# Altium footprint library Dr.Xiong_20160818.PcbLib: 266 footprints (part 12 of 17)
Each footprint in its own frame and in the unit in brackets; x right, y up, seen from the top. Pads: shape width x height; smd on the part's side, far side on the other; paste and mask are expansions set on the pad; w line width, h text height; cw(c..) or ccw(c..) is an arc to the next point about the centre after c.
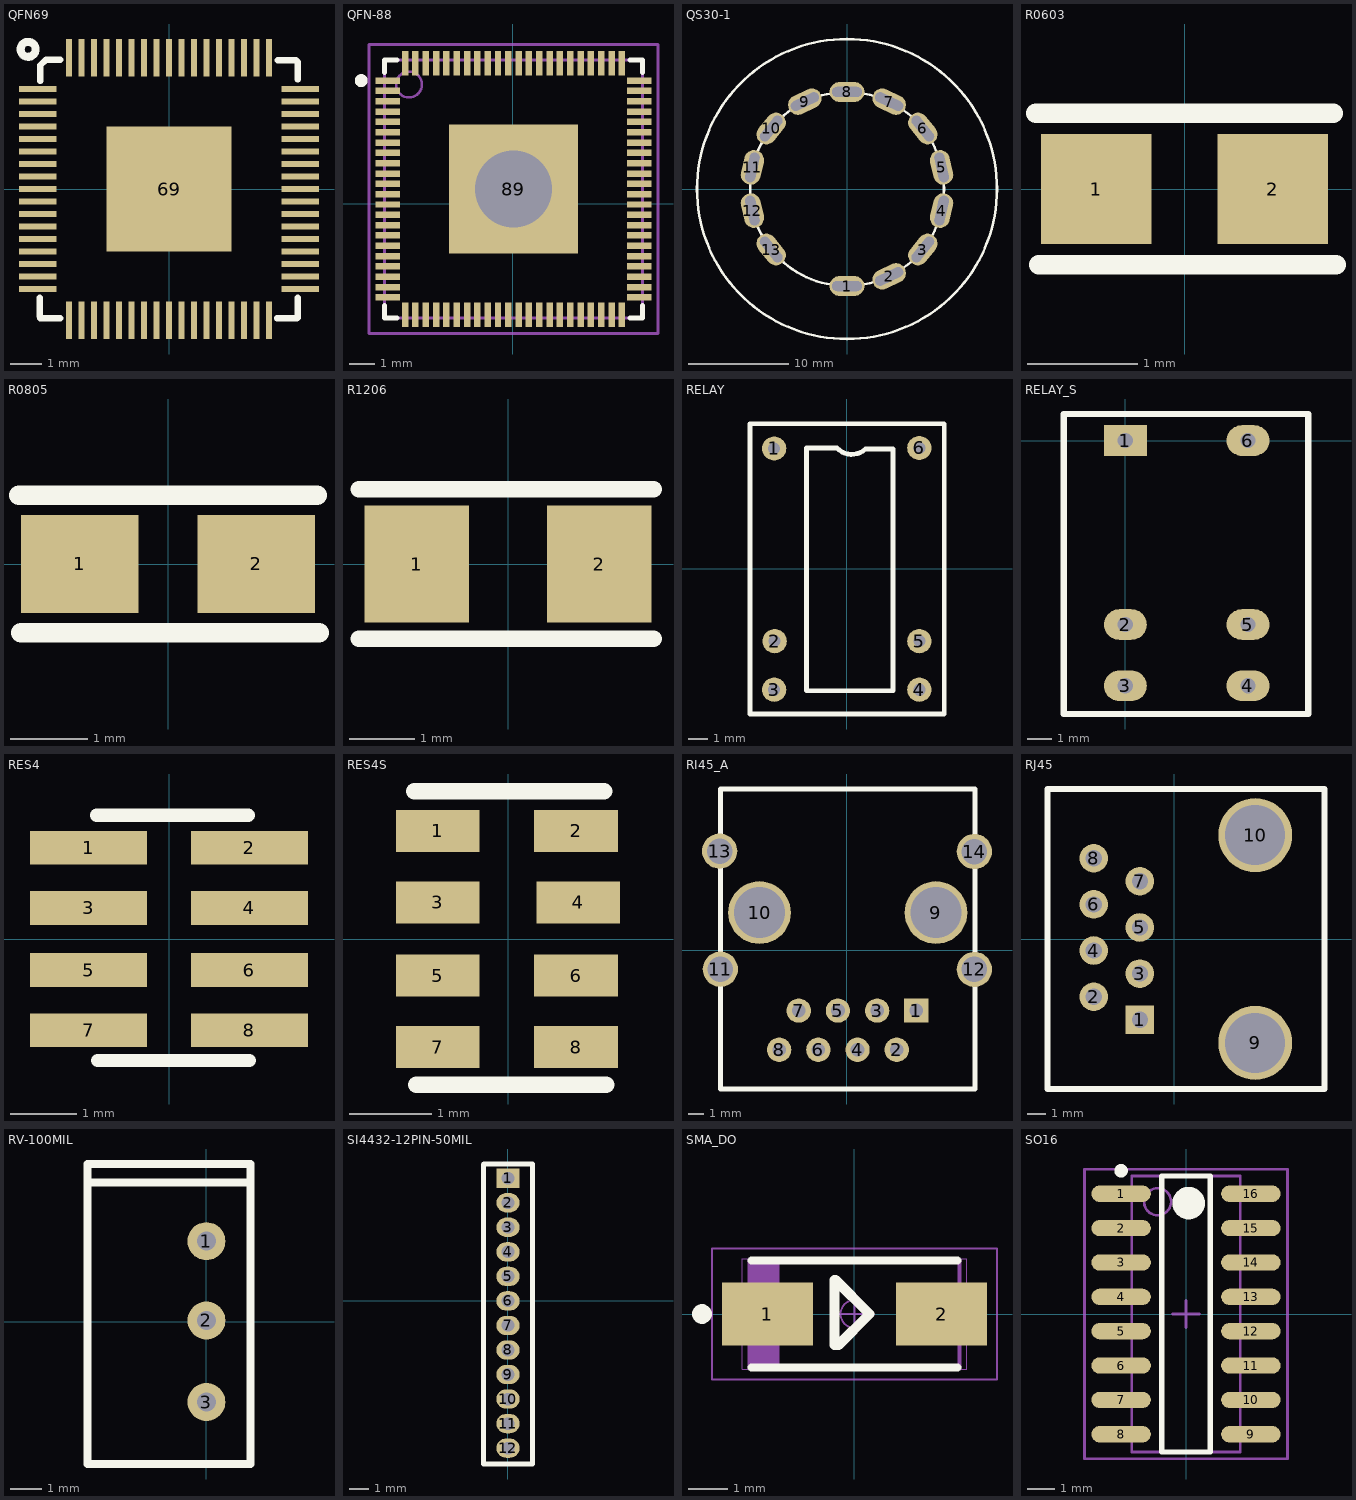
[diagram p11: the footprints below, top view; thin cyan lines are the x and y axes]

## QFN69 [mm]
pads (69):
  rect 1.2x0.2 smd: 1(-4.2,3.2) 2(-4.2,2.8) 3(-4.2,2.4) 4(-4.2,2) 5(-4.2,1.6) 6(-4.2,1.2) 7(-4.2,0.8) 8(-4.2,0.4) 9(-4.2,0) 10(-4.2,-0.4) 11(-4.2,-0.8) 12(-4.2,-1.2) 13(-4.2,-1.6) 14(-4.2,-2) 15(-4.2,-2.4) 16(-4.2,-2.8) 17(-4.2,-3.2) 35(4.2,-3.2) 36(4.2,-2.8) 37(4.2,-2.4) 38(4.2,-2) 39(4.2,-1.6) 40(4.2,-1.2) 41(4.2,-0.8) 42(4.2,-0.4) 43(4.2,0) 44(4.2,0.4) 45(4.2,0.8) 46(4.2,1.2) 47(4.2,1.6) 48(4.2,2) 49(4.2,2.4) 50(4.2,2.8) 51(4.2,3.2)
  rect 0.2x1.2 smd: 18(-3.2,-4.2) 19(-2.8,-4.2) 20(-2.4,-4.2) 21(-2,-4.2) 22(-1.6,-4.2) 23(-1.2,-4.2) 24(-0.8,-4.2) 25(-0.4,-4.2) 26(0,-4.2) 27(0.4,-4.2) 28(0.8,-4.2) 29(1.2,-4.2) 30(1.6,-4.2) 31(2,-4.2) 32(2.4,-4.2) 33(2.8,-4.2) 34(3.2,-4.2) 52(3.2,4.2) 53(2.8,4.2) 54(2.4,4.2) 55(2,4.2) 56(1.6,4.2) 57(1.2,4.2) 58(0.8,4.2) 59(0.4,4.2) 60(0,4.2) 61(-0.4,4.2) 62(-0.8,4.2) 63(-1.2,4.2) 64(-1.6,4.2) 65(-2,4.2) 66(-2.4,4.2) 67(-2.8,4.2) 68(-3.2,4.2)
  rect 4x4 smd: 69(0,0)
Top Overlay:
  circle w0.254: c-4.508,4.47 r0.241
  lines w0.203: -4.14,-3.48 -4.14,-4.064 -4.115,-4.14 -3.48,-4.14 ; -4.115,3.454 -4.115,3.962 -3.937,4.14 -3.48,4.14 ; 3.454,-4.14 4.089,-4.14 4.115,-4.115 4.115,-3.48 ; 3.48,4.115 4.064,4.115 4.115,4.064 4.115,3.505

## QFN-88 [mm]
pads (89):
  rect 0.95x0.249 smd: 1(-4.844,4.769) 3(-4.844,3.969) 5(-4.844,3.169) 7(-4.844,2.369) 9(-4.844,1.569) 11(-4.844,0.769) 13(-4.844,-0.031) 14(-4.844,-0.43) 15(-4.844,-0.831) 16(-4.844,-1.23) 17(-4.844,-1.631) 18(-4.844,-2.03) 19(-4.844,-2.432) 20(-4.844,-2.83) 22(-4.844,-3.63) 45(4.907,-3.63) 47(4.907,-2.83) 48(4.907,-2.432) 49(4.907,-2.03) 50(4.907,-1.631) 51(4.907,-1.23) 52(4.907,-0.831) 53(4.907,-0.43) 54(4.907,-0.031) 56(4.907,0.769) 58(4.907,1.569) 60(4.907,2.369) 62(4.907,3.169) 64(4.907,3.969) 66(4.907,4.769)
  rect 0.95x0.251 smd: 2(-4.844,4.369) 4(-4.844,3.569) 6(-4.844,2.769) 8(-4.844,1.969) 10(-4.844,1.169) 12(-4.844,0.369) 21(-4.844,-3.23) 46(4.907,-3.23) 55(4.907,0.369) 57(4.907,1.169) 59(4.907,1.969) 61(4.907,2.769) 63(4.907,3.569) 65(4.907,4.369)
  rect 0.249x0.95 smd: 23(-4.169,-4.306) 24(-3.77,-4.306) 25(-3.369,-4.306) 26(-2.97,-4.306) 27(-2.569,-4.306) 28(-2.17,-4.306) 30(-1.37,-4.306) 32(-0.57,-4.306) 34(0.231,-4.306) 36(1.031,-4.306) 38(1.831,-4.306) 40(2.631,-4.306) 42(3.431,-4.306) 44(4.231,-4.306) 67(4.231,5.445) 69(3.431,5.445) 71(2.631,5.445) 73(1.831,5.445) 75(1.031,5.445) 77(0.231,5.445) 79(-0.57,5.445) 81(-1.37,5.445) 83(-2.17,5.445) 84(-2.569,5.445) 85(-2.97,5.445) 86(-3.369,5.445) 87(-3.77,5.445) 88(-4.169,5.445)
  rect 0.251x0.95 smd: 29(-1.77,-4.306) 31(-0.97,-4.306) 33(-0.17,-4.306) 35(0.631,-4.306) 37(1.431,-4.306) 39(2.231,-4.306) 41(3.031,-4.306) 43(3.831,-4.306) 68(3.831,5.445) 70(3.031,5.445) 72(2.231,5.445) 74(1.431,5.445) 76(0.631,5.445) 78(-0.17,5.445) 80(-0.97,5.445) 82(-1.77,5.445)
  rect 5x5 hole 3: 89(0.031,0.569)
via 0.03,0.568 diameter 0.66 hole 0.33
Top Overlay:
  lines w0.2: -4.969,-3.956 -4.969,-4.431 -4.494,-4.431 ; -4.969,5.094 -4.969,5.569 -4.494,5.569 ; 4.556,-4.431 5.031,-4.431 5.031,-3.956 ; 4.556,5.569 5.031,5.569 5.031,5.094
  lines w0.25: -5.745,4.758 cw(c-5.869,4.769) -5.744,4.769
Mechanical 3:
  lines w0.1: -3.52,4.608 cw(c-4.019,4.618) -3.519,4.619 ; -0.471,0.568 0.53,0.568 ; 0.03,0.07 0.03,1.069 ; -5.568,-5.03 -5.568,6.169 5.631,6.169 5.631,-5.03 -5.568,-5.03 ; -4.969,-4.431 -4.969,5.569 5.031,5.569 5.031,-4.431 -4.969,-4.431
Mechanical 15:
  lines w0.003: 1.215,0.671 1.265,0.722

## QS30-1 [mm]
pads (13):
  oval 3.5x2 hole 1 slot 3 at 0 deg: 1(0,-9.7) 8(0,9.7)
  oval 2x3.5 hole 1 slot 3 at 25.71 deg rot 115.71: 2(4.21,-8.74) 9(-4.21,8.74)
  oval 2x3.5 hole 1 slot 3 at 51.43 deg rot 141.43: 3(7.58,-6.05) 10(-7.58,6.05)
  oval 2x3.5 hole 1 slot 3 at 77.14 deg rot 167.14: 4(9.46,-2.16) 11(-9.46,2.16)
  oval 2x3.5 hole 1 slot 3 at 102.86 deg rot 12.86: 5(9.46,2.16) 12(-9.46,-2.16)
  oval 2x3.5 hole 1 slot 3 at 128.57 deg rot 38.57: 6(7.58,6.05) 13(-7.58,-6.05)
  oval 2x3.5 hole 1 slot 3 at 154.28 deg rot 64.28: 7(4.21,8.74)
Top Overlay:
  circle w0.254: c0,0 r15
  circle w0.254: c0,0 r9.7

## R0603 [mm]
pads (2):
  rect 1x1 smd: 1(-0.799,0) 2(0.799,0)
Top Overlay:
  lines w0.178: -1.346,0.686 1.346,0.686 ; -1.321,-0.686 1.372,-0.686

## R0805 [mil]
pads (2):
  rect 60x50 smd: 1(-45,0) 2(45,0)
Top Overlay:
  lines w10: -76,35 76,35 ; -75,-35 77,-35

## R1206 [mm]
pads (2):
  rect 1.6x1.8 smd: 1(-1.4,0) 2(1.4,0)
Top Overlay:
  lines w0.254: -2.286,-1.143 2.235,-1.143 ; -2.286,1.143 2.235,1.143

## RELAY [mm]
pads (6):
  round 1.27 hole 0.635: 1(-3.812,6.325) 2(-3.787,-3.8) 3(-3.812,-6.35) 4(3.813,-6.35) 5(3.813,-3.8) 6(3.812,6.35)
Top Overlay:
  lines w0.254: -5.1,7.625 5.1,7.625 5.125,7.6 5.125,-7.625 -5.075,-7.625 -5.075,7.625 ; 2.437,-6.4 -2.112,-6.4 -2.112,6.35 -0.512,6.35 ccw(c0.263,7.075) 0.988,6.3 2.438,6.3 2.438,-6.4 ; 2.437,-6.4 2.438,-6.4

## RELAY_S [mil]
pads (6):
  rect 70x50 hole 25: 1(0,0)
  oval 70x50 hole 25: 2(0,-300) 3(0,-400) 4(200,-400) 5(200,-300) 6(200,0)
Top Overlay:
  lines w10: -100.39,-445.87 -100.39,43.31 298.23,43.31 298.23,-445.87 -100.39,-445.87

## RES4 [mil]
pads (8):
  rect 70x20 smd: 1(-48,54.5) 2(48,54.5) 3(-48,18.5) 4(48,18.5) 5(-48,-18.5) 6(48,-18.5) 7(-48,-54.5) 8(48,-54.5)
Top Overlay:
  lines w7.87: -43.31,73.82 47.24,73.82 ; -42.55,-72.5 48,-72.5

## RES4S [mil]
pads (8):
  rect 40x20 smd: 1(-33.5,51.5) 2(32.5,51.5) 3(-33.5,17.5) 4(33.5,17.5) 5(-33.5,-17.5) 6(32.5,-17.5) 7(-33.5,-51.5) 8(32.5,-51.5)
Top Overlay:
  lines w7.87: -44.79,70.37 45.76,70.37 ; -43.81,-69.4 46.74,-69.4

## RI45_A [mil]
pads (14):
  rect 62x62 hole 35: 1(176.89,-153.35)
  round 62 hole 35: 2(126.89,-253.35) 3(76.89,-153.35) 4(26.89,-253.35) 5(-23.11,-153.35) 6(-73.11,-253.35) 7(-123.11,-153.35) 8(-173.11,-253.35)
  round 160 hole 130 unplated: 9(226.89,96.65) 10(-223.11,96.65)
  round 90 hole 65: 11(-322.93,-47.83) 12(324.89,-48.35) 13(-324.89,253.35) 14(324.71,252.36)
Top Overlay:
  lines w13: -323.11,-353.35 -323.11,411.81 326.89,411.81 326.89,-353.35 -323.11,-353.35

## RJ45 [mil]
pads (10):
  rect 62x62 hole 35: 1(-75,-175)
  round 62 hole 35: 2(-175,-125) 3(-75,-75) 4(-175,-25) 5(-75,25) 6(-175,75) 7(-75,125) 8(-175,175)
  round 160 hole 130 unplated: 9(175,-225) 10(175,225)
Top Overlay:
  lines w13: -275,-325 325,-325 325,325 -275,325 -275,-325

## RV-100MIL [mm]
pads (3):
  round 1.2 hole 0.6: 1(0,2.54) 2(0,0.038) 3(0,-2.54)
Top Overlay:
  lines w0.254: -3.708,4.394 1.295,4.394 ; -3.759,-4.496 -1.765,-4.496 1.397,-4.496 1.397,4.978 -1.46,4.978 -3.759,4.978 -3.759,-4.496

## SI4432-12PIN-50MIL [mm]
pads (12):
  rect 1.2x1 hole 0.65: 1(0,6.35)
  oval 1.2x1 hole 0.65: 2(0,5.08) 3(0,3.81) 4(0,2.54) 5(0,1.27) 6(0,0) 7(0,-1.27) 8(0,-2.54) 9(0,-3.81) 10(0,-5.08) 11(0,-6.352) 12(0,-7.622)
Top Overlay:
  lines w0.254: -1.27,-8.433 1.27,-8.433 1.27,7.087 -1.245,7.087 -1.27,7.061 -1.27,-8.433
Bottom Overlay:
  lines w0.254: -1.27,-5.82 -1.27,7.087 ; -1.27,-5.763 -1.27,0.737 ; -1.27,-5.39 -1.27,-8.353 -1.181,-8.442 1.271,-8.442 1.27,-8.441 1.27,-4.729 ; -1.27,0.587 -1.27,7.087 ; -1.27,1.83 -1.27,-3.29 ; 1.27,-5.766 1.27,0.734 ; 1.27,-3.47 1.27,-5.82 ; 1.27,-3.29 1.27,0.83 ; 1.27,0.584 1.27,7.084 1.268,7.087 -1.27,7.087 ; -1.27,-3.29 -1.27,-3.29 ; 1.27,-5.82 1.27,-5.82

## SMA_DO [mm]
pads (2):
  rect 2.3x1.6 smd: 1(-2.2,0) 2(2.2,0)
Top Overlay:
  circle w0.25: c-3.85,0 r0.125
  lines w0.2: -2.6,-1.35 2.6,-1.35 ; -2.6,1.35 2.6,1.35
  lines w0.254: -0.508,0.864 -0.508,-0.787 -0.406,-0.787 0.381,0 ; -0.483,0.864 0.381,0 ; 0.356,0 0.381,0
Mechanical 15:
  lines w0.1: -2.548,-1.335 -2.548,1.335 ; -2.448,-1.335 -2.448,1.335 ; -2.348,-1.335 -2.348,1.335 ; -2.248,-1.335 -2.248,1.335 ; -2.148,-1.335 -2.148,1.335 ; -2.047,-1.335 -2.047,1.335 ; -1.948,-1.335 -1.948,1.335 ; -2.648,-1.335 -2.648,1.335 2.648,1.335 2.648,-1.335 -2.648,-1.335
Mechanical 16:
  circle w0.05: c0,0 r0.35
  lines w0.001: -2.83,-1.4 -2.83,1.4 2.83,1.4 2.83,-1.4 -2.83,-1.4
  lines w0.05: -0.5,0 0.5,0 ; 0,-0.5 0,0.5 ; -3.6,-1.65 -3.6,1.65 3.6,1.65 3.6,-1.65 -3.6,-1.65

## SO16 [mm]
pads (16):
  oval 2.2x0.6 smd: 1(-2.4,4.445) 2(-2.4,3.175) 3(-2.4,1.905) 4(-2.4,0.635) 5(-2.4,-0.635) 6(-2.4,-1.905) 7(-2.4,-3.175) 8(-2.4,-4.445) 9(2.4,-4.445) 10(2.4,-3.175) 11(2.4,-1.905) 12(2.4,-0.635) 13(2.4,0.635) 14(2.4,1.905) 15(2.4,3.175) 16(2.4,4.445)
Top Overlay:
  circle w0.25: c-2.4,5.295 r0.125
  circle w0.6: c0.1,4.1 r0.3
  lines w0.2: -0.9,-5.1 -0.9,5.1 0.9,5.1 0.9,-5.1 -0.9,-5.1
Mechanical 13:
  circle w0.1: c-1.05,4.15 r0.5
  lines w0.1: -2,-5.1 -2,5.1 2,5.1 2,-5.1 -2,-5.1
Mechanical 15:
  lines w0.1: -0.5,0 0.5,0 ; 0,-0.5 0,0.5 ; -3.75,-5.35 -3.75,5.35 3.75,5.35 3.75,-5.35 -3.75,-5.35
3D body: height 1.75, standoff 0.17, extent -2,-5.1 2,5.1